# Altium footprint library 封装库.PcbLib: 755 footprints (part 42 of 48)
Each footprint in its own frame and in the unit in brackets; x right, y up, seen from the top. Pads: shape width x height; smd on the part's side, far side on the other; paste and mask are expansions set on the pad; w line width, h text height; cw(c..) or ccw(c..) is an arc to the next point about the centre after c.
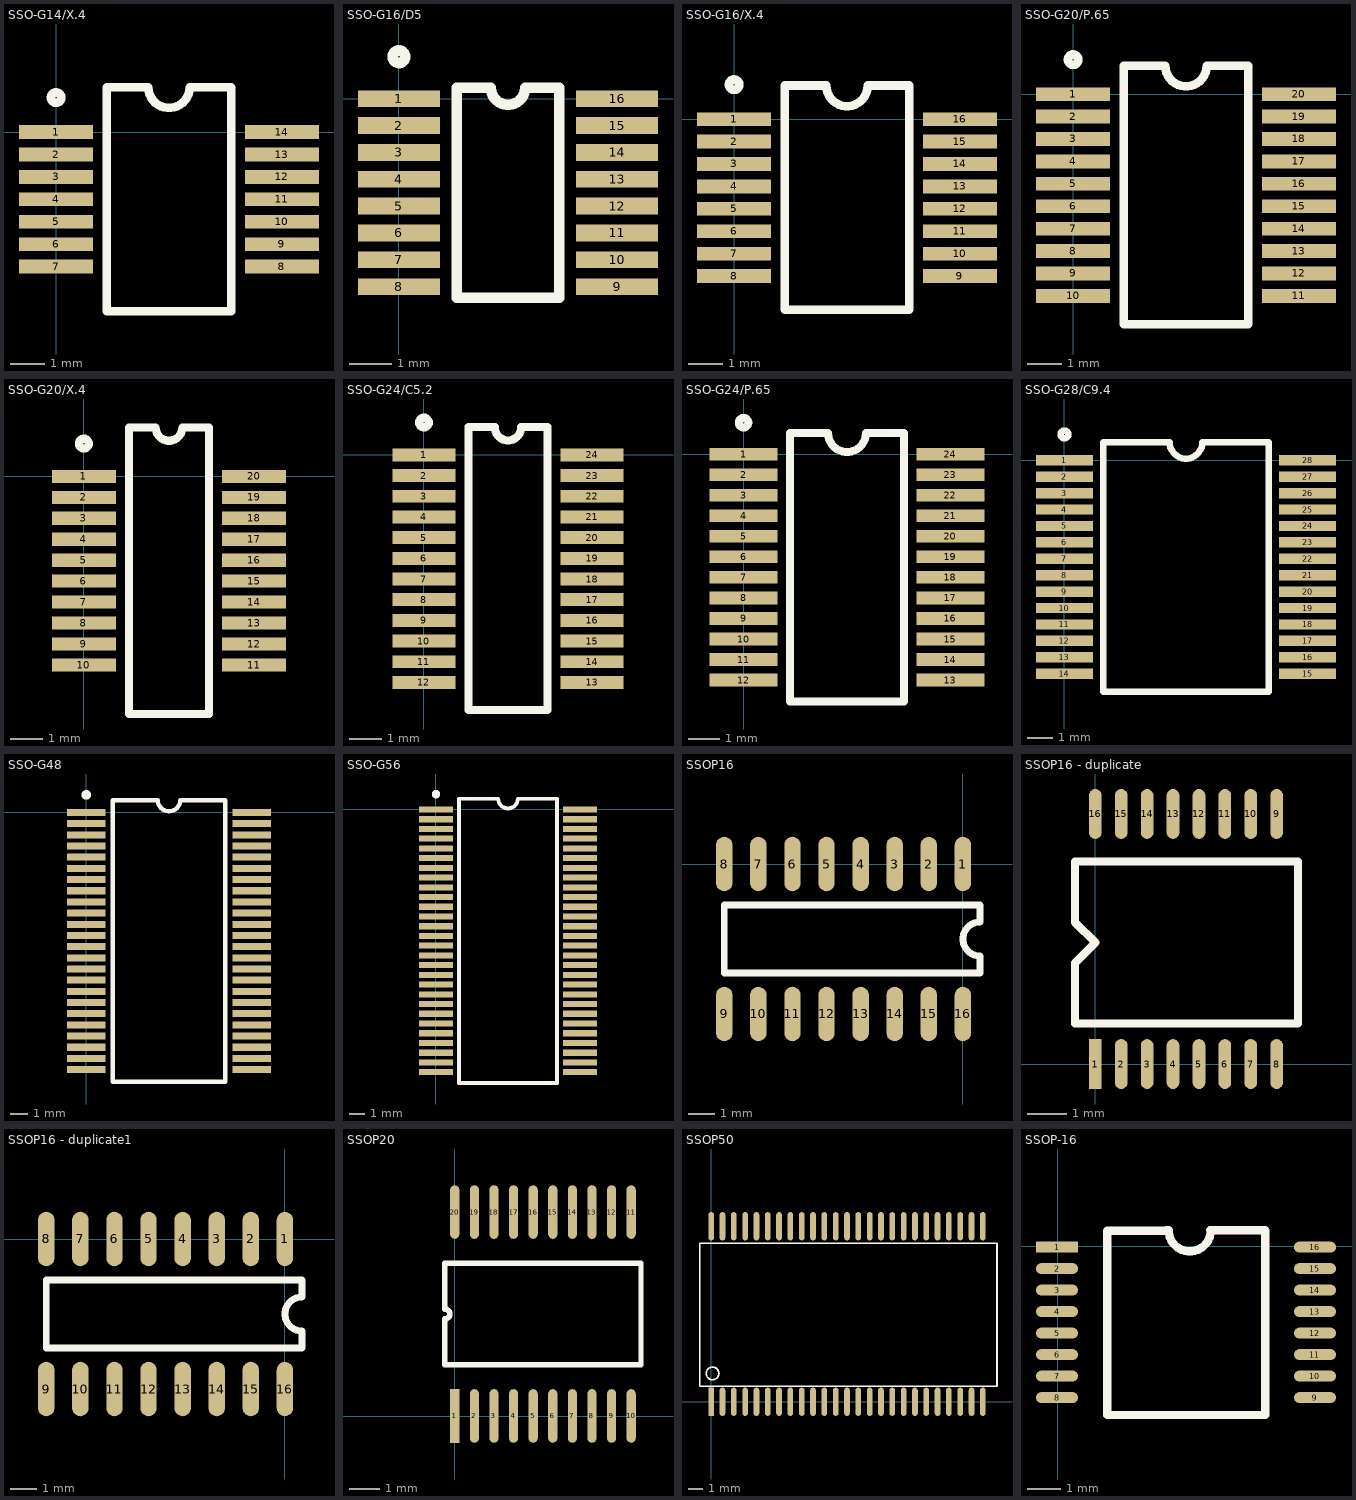
[diagram p41: the footprints below, top view; thin cyan lines are the x and y axes]

## SSO-G14/X.4 [mm]
pads (14):
  rect 2.15x0.4 smd: 1(0,0) 2(0,-0.65) 3(0,-1.3) 4(0,-1.95) 5(0,-2.6) 6(0,-3.25) 7(0,-3.9) 8(6.55,-3.9) 9(6.55,-3.25) 10(6.55,-2.6) 11(6.55,-1.95) 12(6.55,-1.3) 13(6.55,-0.65) 14(6.55,0)
Top Overlay:
  circle w0.25: c0,1 r0.15
  lines w0.25: 1.475,-5.2 1.475,1.3 2.675,1.3 ccw(c3.275,1.3) 3.875,1.3 5.075,1.3 5.075,-5.2 1.475,-5.2

## SSO-G16/D5 [mm]
pads (16):
  rect 1.95x0.4 smd: 1(0,0) 2(0,-0.64) 3(0,-1.28) 4(0,-1.92) 5(0,-2.56) 6(0,-3.2) 7(0,-3.84) 8(0,-4.48) 9(5.2,-4.48) 10(5.2,-3.84) 11(5.2,-3.2) 12(5.2,-2.56) 13(5.2,-1.92) 14(5.2,-1.28) 15(5.2,-0.64) 16(5.2,0)
Top Overlay:
  circle w0.25: c0,1 r0.15
  lines w0.25: 1.375,-4.74 1.375,0.26 2.192,0.26 ccw(c2.6,0.26) 3.008,0.26 3.825,0.26 3.825,-4.74 1.375,-4.74

## SSO-G16/X.4 [mm]
pads (16):
  rect 2.15x0.4 smd: 1(0,0) 2(0,-0.65) 3(0,-1.3) 4(0,-1.95) 5(0,-2.6) 6(0,-3.25) 7(0,-3.9) 8(0,-4.55) 9(6.55,-4.55) 10(6.55,-3.9) 11(6.55,-3.25) 12(6.55,-2.6) 13(6.55,-1.95) 14(6.55,-1.3) 15(6.55,-0.65) 16(6.55,0)
Top Overlay:
  circle w0.25: c0,1 r0.15
  lines w0.25: 1.475,-5.525 5.075,-5.525 5.075,0.975 3.875,0.975 cw(c3.275,0.975) 2.675,0.975 1.475,0.975 1.475,-5.525

## SSO-G20/P.65 [mm]
pads (20):
  rect 2.15x0.4 smd: 1(0,0) 2(0,-0.65) 3(0,-1.3) 4(0,-1.95) 5(0,-2.6) 6(0,-3.25) 7(0,-3.9) 8(0,-4.55) 9(0,-5.2) 10(0,-5.85) 11(6.55,-5.85) 12(6.55,-5.2) 13(6.55,-4.55) 14(6.55,-3.9) 15(6.55,-3.25) 16(6.55,-2.6) 17(6.55,-1.95) 18(6.55,-1.3) 19(6.55,-0.65) 20(6.55,0)
Top Overlay:
  circle w0.25: c0,1 r0.15
  lines w0.25: 1.475,-6.675 1.475,0.825 2.675,0.825 ccw(c3.275,0.825) 3.875,0.825 5.075,0.825 5.075,-6.675 1.475,-6.675

## SSO-G20/X.4 [mm]
pads (20):
  rect 1.95x0.4 smd: 1(0,0) 2(0,-0.64) 3(0,-1.28) 4(0,-1.92) 5(0,-2.56) 6(0,-3.2) 7(0,-3.84) 8(0,-4.48) 9(0,-5.12) 10(0,-5.76) 11(5.2,-5.76) 12(5.2,-5.12) 13(5.2,-4.48) 14(5.2,-3.84) 15(5.2,-3.2) 16(5.2,-2.56) 17(5.2,-1.92) 18(5.2,-1.28) 19(5.2,-0.64) 20(5.2,0)
Top Overlay:
  circle w0.25: c0,1 r0.15
  lines w0.25: 1.375,-7.255 1.375,1.495 2.192,1.495 ccw(c2.6,1.495) 3.008,1.495 3.825,1.495 3.825,-7.255 1.375,-7.255

## SSO-G24/C5.2 [mm]
pads (24):
  rect 1.95x0.4 smd: 1(0,0) 2(0,-0.64) 3(0,-1.28) 4(0,-1.92) 5(0,-2.56) 6(0,-3.2) 7(0,-3.84) 8(0,-4.48) 9(0,-5.12) 10(0,-5.76) 11(0,-6.4) 12(0,-7.04) 13(5.2,-7.04) 14(5.2,-6.4) 15(5.2,-5.76) 16(5.2,-5.12) 17(5.2,-4.48) 18(5.2,-3.84) 19(5.2,-3.2) 20(5.2,-2.56) 21(5.2,-1.92) 22(5.2,-1.28) 23(5.2,-0.64) 24(5.2,0)
Top Overlay:
  circle w0.25: c0,1 r0.15
  lines w0.25: 1.375,-7.895 1.375,0.855 2.192,0.855 ccw(c2.6,0.855) 3.008,0.855 3.825,0.855 3.825,-7.895 1.375,-7.895

## SSO-G24/P.65 [mm]
pads (24):
  rect 2.15x0.4 smd: 1(0,0) 2(0,-0.65) 3(0,-1.3) 4(0,-1.95) 5(0,-2.6) 6(0,-3.25) 7(0,-3.9) 8(0,-4.55) 9(0,-5.2) 10(0,-5.85) 11(0,-6.5) 12(0,-7.15) 13(6.55,-7.15) 14(6.55,-6.5) 15(6.55,-5.85) 16(6.55,-5.2) 17(6.55,-4.55) 18(6.55,-3.9) 19(6.55,-3.25) 20(6.55,-2.6) 21(6.55,-1.95) 22(6.55,-1.3) 23(6.55,-0.65) 24(6.55,0)
Top Overlay:
  circle w0.25: c0,1 r0.15
  lines w0.25: 3.875,0.675 cw(c3.275,0.675) 2.675,0.675 1.475,0.675 1.475,-7.825 5.075,-7.825 5.075,0.675 3.875,0.675

## SSO-G28/C9.4 [mm]
pads (28):
  rect 2.2x0.4 smd: 1(0,0) 2(0,-0.635) 3(0,-1.27) 4(0,-1.905) 5(0,-2.54) 6(0,-3.175) 7(0,-3.81) 8(0,-4.445) 9(0,-5.08) 10(0,-5.715) 11(0,-6.35) 12(0,-6.985) 13(0,-7.62) 14(0,-8.255) 15(9.4,-8.255) 16(9.4,-7.62) 17(9.4,-6.985) 18(9.4,-6.35) 19(9.4,-5.715) 20(9.4,-5.08) 21(9.4,-4.445) 22(9.4,-3.81) 23(9.4,-3.175) 24(9.4,-2.54) 25(9.4,-1.905) 26(9.4,-1.27) 27(9.4,-0.635) 28(9.4,0)
Top Overlay:
  circle w0.25: c0,1 r0.15
  lines w0.25: 1.5,-8.953 1.5,0.698 4.065,0.698 ccw(c4.7,0.698) 5.335,0.698 7.9,0.698 7.9,-8.953 1.5,-8.953

## SSO-G48 [mm]
pads (48):
  rect 2.2x0.4 smd: 1(0,0) 2(0,-0.635) 3(0,-1.27) 4(0,-1.905) 5(0,-2.54) 6(0,-3.175) 7(0,-3.81) 8(0,-4.445) 9(0,-5.08) 10(0,-5.715) 11(0,-6.35) 12(0,-6.985) 13(0,-7.62) 14(0,-8.255) 15(0,-8.89) 16(0,-9.525) 17(0,-10.16) 18(0,-10.795) 19(0,-11.43) 20(0,-12.065) 21(0,-12.7) 22(0,-13.335) 23(0,-13.97) 24(0,-14.605) 25(9.4,-14.605) 26(9.4,-13.97) 27(9.4,-13.335) 28(9.4,-12.7) 29(9.4,-12.065) 30(9.4,-11.43) 31(9.4,-10.795) 32(9.4,-10.16) 33(9.4,-9.525) 34(9.4,-8.89) 35(9.4,-8.255) 36(9.4,-7.62) 37(9.4,-6.985) 38(9.4,-6.35) 39(9.4,-5.715) 40(9.4,-5.08) 41(9.4,-4.445) 42(9.4,-3.81) 43(9.4,-3.175) 44(9.4,-2.54) 45(9.4,-1.905) 46(9.4,-1.27) 47(9.4,-0.635) 48(9.4,0)
Top Overlay:
  circle w0.25: c0,1 r0.15
  lines w0.25: 1.5,-15.303 1.5,0.698 4.065,0.698 ccw(c4.7,0.698) 5.335,0.698 7.9,0.698 7.9,-15.303 1.5,-15.303

## SSO-G56 [mm]
pads (56):
  rect 2.2x0.4 smd: 1(0,0) 2(0,-0.635) 3(0,-1.27) 4(0,-1.905) 5(0,-2.54) 6(0,-3.175) 7(0,-3.81) 8(0,-4.445) 9(0,-5.08) 10(0,-5.715) 11(0,-6.35) 12(0,-6.985) 13(0,-7.62) 14(0,-8.255) 15(0,-8.89) 16(0,-9.525) 17(0,-10.16) 18(0,-10.795) 19(0,-11.43) 20(0,-12.065) 21(0,-12.7) 22(0,-13.335) 23(0,-13.97) 24(0,-14.605) 25(0,-15.24) 26(0,-15.875) 27(0,-16.51) 28(0,-17.145) 29(9.4,-17.145) 30(9.4,-16.51) 31(9.4,-15.875) 32(9.4,-15.24) 33(9.4,-14.605) 34(9.4,-13.97) 35(9.4,-13.335) 36(9.4,-12.7) 37(9.4,-12.065) 38(9.4,-11.43) 39(9.4,-10.795) 40(9.4,-10.16) 41(9.4,-9.525) 42(9.4,-8.89) 43(9.4,-8.255) 44(9.4,-7.62) 45(9.4,-6.985) 46(9.4,-6.35) 47(9.4,-5.715) 48(9.4,-5.08) 49(9.4,-4.445) 50(9.4,-3.81) 51(9.4,-3.175) 52(9.4,-2.54) 53(9.4,-1.905) 54(9.4,-1.27) 55(9.4,-0.635) 56(9.4,0)
Top Overlay:
  circle w0.25: c0,1 r0.15
  lines w0.25: 1.5,-17.848 7.9,-17.848 7.9,0.702 5.335,0.702 cw(c4.7,0.702) 4.065,0.702 1.5,0.702 1.5,-17.848

## SSOP16 [mil]
pads (16):
  oval 24x80 smd: 1(0.17,0.43) 2(-49.83,0.43) 3(-99.83,0.43) 4(-149.83,0.43) 5(-199.83,0.43) 6(-249.83,0.43) 7(-299.83,0.43) 8(-349.83,0.43) 9(-349.83,-219.57) 10(-299.83,-219.57) 11(-249.83,-219.57) 12(-199.83,-219.57) 13(-149.83,-219.57) 14(-99.83,-219.57) 15(-49.83,-219.57) 16(0.17,-219.57)
Top Overlay:
  lines w10: -349.83,-159.57 -349.83,-59.57 25.17,-59.57 25.17,-84.57 ccw(c25.17,-109.57) 25.17,-134.57 25.17,-159.57 -349.83,-159.57

## SSOP16 - duplicate [mm]
pads (16):
  rect 0.32x1.25 smd: 1(0,0)
  oval 0.32x1.25 smd: 2(0.65,0) 3(1.3,0) 4(1.95,0) 5(2.6,0) 6(3.25,0) 7(3.9,0) 8(4.55,0) 9(4.55,6.276) 10(3.9,6.276) 11(3.25,6.276) 12(2.6,6.276) 13(1.95,6.276) 14(1.3,6.276) 15(0.65,6.276) 16(0,6.276)
Top Overlay:
  lines w0.203: -0.508,1.016 -0.508,2.54 0,3.048 -0.508,3.556 -0.508,5.08 5.08,5.08 5.08,1.016 -0.508,1.016

## SSOP16 - duplicate1 [mil]
height 509.06
pads (16):
  oval 24x80 smd: 1(0.17,0.43) 2(-49.83,0.43) 3(-99.83,0.43) 4(-149.83,0.43) 5(-199.83,0.43) 6(-249.83,0.43) 7(-299.83,0.43) 8(-349.83,0.43) 9(-349.83,-219.57) 10(-299.83,-219.57) 11(-249.83,-219.57) 12(-199.83,-219.57) 13(-149.83,-219.57) 14(-99.83,-219.57) 15(-49.83,-219.57) 16(0.17,-219.57)
Top Overlay:
  lines w10: -349.83,-159.57 -349.83,-59.57 25.17,-59.57 25.17,-84.57 ccw(c25.17,-109.57) 25.17,-134.57 25.17,-159.57 -349.83,-159.57

## SSOP20 [mil]
pads (20):
  rect 12x70 smd: 1(0,0.06)
  oval 12x70 smd: 2(25.59,0.06) 3(51.18,0.06) 4(76.77,0.06) 5(102.36,0.06) 6(127.95,0.06) 7(153.54,0.06) 8(179.13,0.06) 9(204.72,0.06) 10(230.31,0.06) 11(230.31,266.28) 12(204.72,266.28) 13(179.13,266.28) 14(153.54,266.28) 15(127.95,266.28) 16(102.36,266.28) 17(76.77,266.28) 18(51.18,266.28) 19(25.59,266.28) 20(0,266.28)
Top Overlay:
  lines w7.09: -12.79,66.84 243.11,66.84 243.11,199.51 -12.79,199.51 -12.79,139.57 cw(c-12.79,133.17) -12.8,126.78 -12.79,66.84

## SSOP50 [mm]
pads (50):
  rect 0.4x2 smd: 1(0,0)
  oval 0.4x2 smd: 2(0.8,0) 3(1.6,0) 4(2.4,0) 5(3.2,0) 6(4,0) 7(4.8,0) 8(5.6,0) 9(6.4,0) 10(7.2,0) 11(8,0) 12(8.8,0) 13(9.6,0) 14(10.4,0) 15(11.2,0) 16(12,0) 17(12.8,0) 18(13.6,0) 19(14.4,0) 20(15.2,0) 21(16,0) 22(16.8,0) 23(17.6,0) 24(18.4,0) 25(19.2,0) 26(19.2,12.4) 27(18.4,12.4) 28(17.6,12.4) 29(16.8,12.4) 30(16,12.4) 31(15.2,12.4) 32(14.4,12.4) 33(13.6,12.4) 34(12.8,12.4) 35(12,12.4) 36(11.2,12.4) 37(10.4,12.4) 38(9.6,12.4) 39(8.8,12.4) 40(8,12.4) 41(7.2,12.4) 42(6.4,12.4) 43(5.6,12.4) 44(4.8,12.4) 45(4,12.4) 46(3.2,12.4) 47(2.4,12.4) 48(1.6,12.4) 49(0.8,12.4) 50(0,12.4)
Top Overlay:
  circle w0.127: c0.1,2 r0.447
  lines w0.127: -0.8,1.1 -0.8,11.2 20.2,11.2 20.2,1.1 -0.8,1.1

## SSOP-16 [mm]
pads (16):
  rect 1.27x0.33 smd: 1(-0.025,-0.025)
  oval 1.27x0.33 smd: 2(-0.025,-0.675) 3(-0.025,-1.325) 4(-0.025,-1.975) 5(-0.025,-2.625) 6(-0.025,-3.275) 7(-0.025,-3.925) 8(-0.025,-4.575) 9(7.775,-4.575) 10(7.775,-3.925) 11(7.775,-3.275) 12(7.775,-2.625) 13(7.775,-1.975) 14(7.775,-1.325) 15(7.775,-0.675) 16(7.775,-0.025)
Top Overlay:
  lines w0.254: 1.499,-5.1 1.499,0.475 3.269,0.475 3.277,0.483 ; 1.549,-5.1 6.274,-5.1 6.274,0.475 6.266,0.483 4.6,0.483 ; 3.353,0.483 ccw(c3.988,0.483) 4.623,0.483